# Altium footprint library TH_Connectors.PcbLib: 83 footprints (part 4 of 6)
Each footprint in its own frame and in the unit in brackets; x right, y up, seen from the top. Pads: shape width x height; smd on the part's side, far side on the other; paste and mask are expansions set on the pad; w line width, h text height; cw(c..) or ccw(c..) is an arc to the next point about the centre after c.
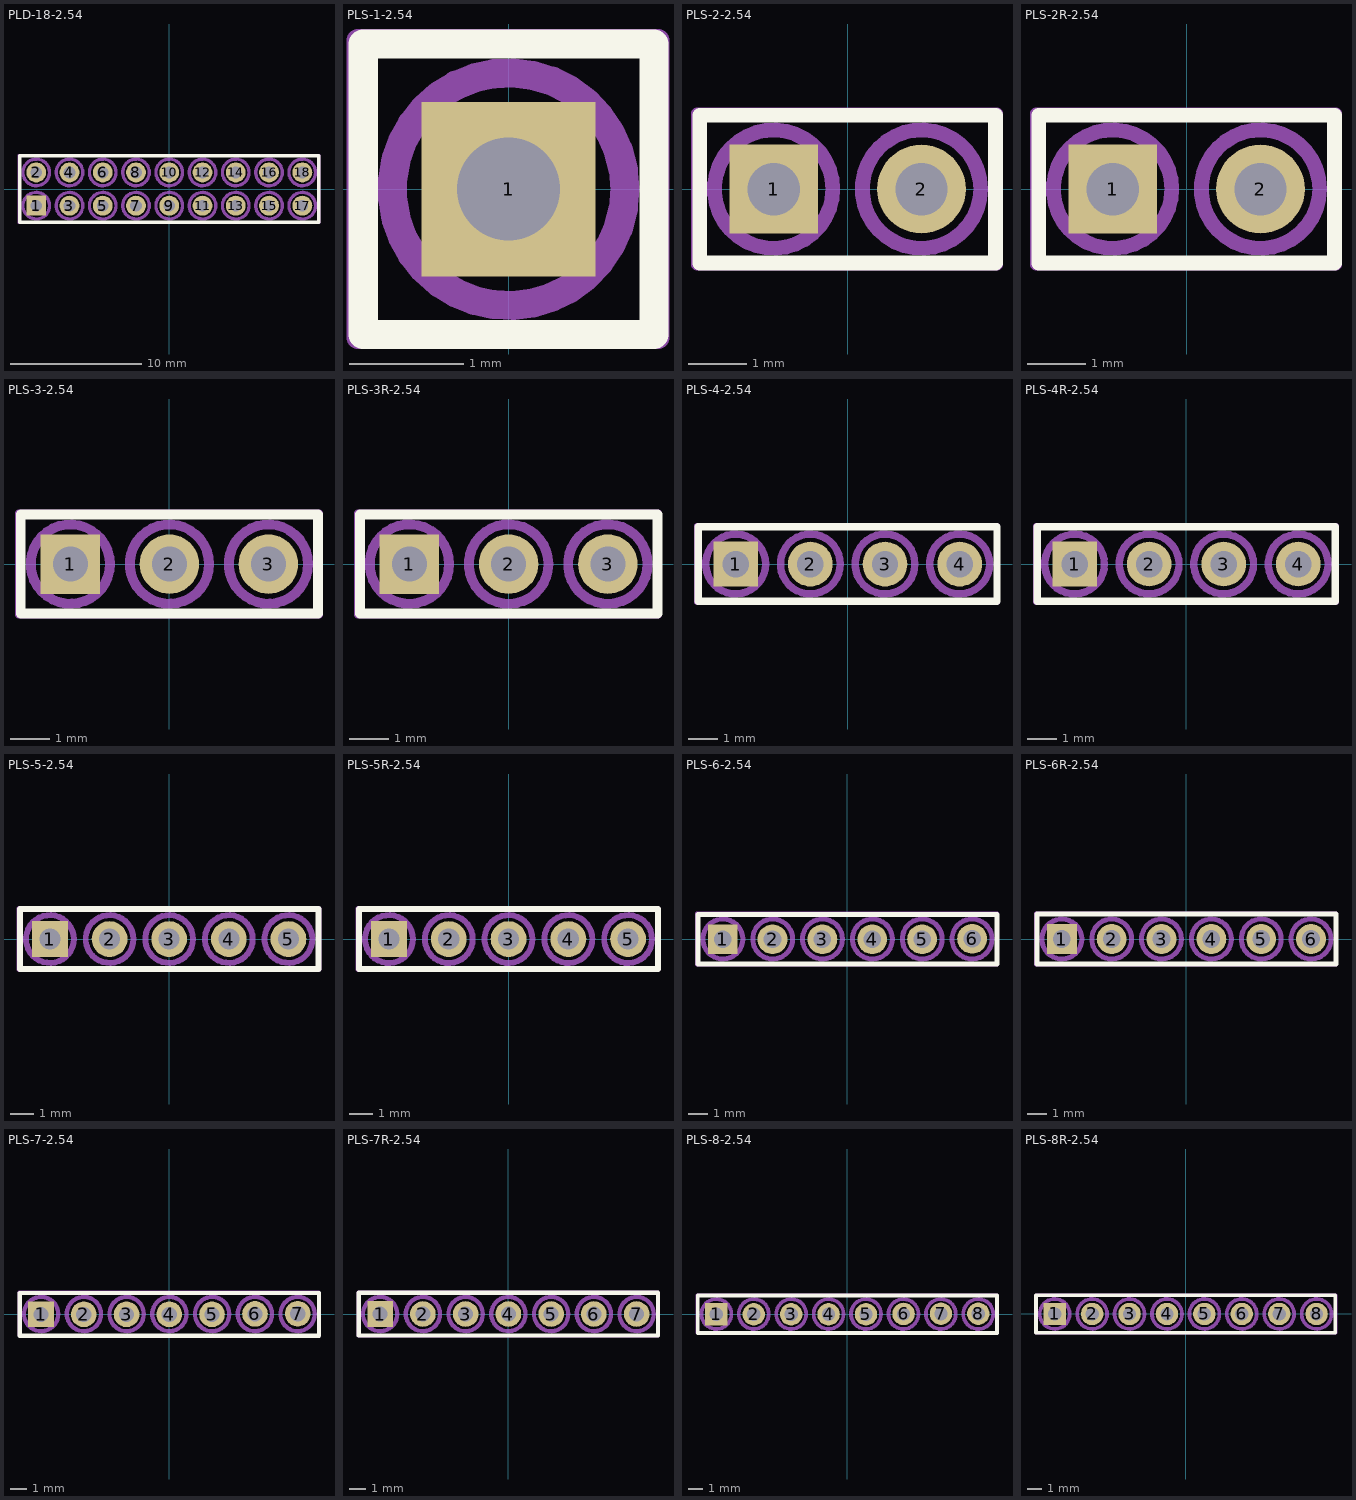
[diagram p3: the footprints below, top view; thin cyan lines are the x and y axes]

## PLD-18-2.54 [mil]
pads (18):
  rect 60x60 hole 35.43: 1(-400,-50)
  round 60 hole 35.43: 2(-400,50) 3(-300,-50) 4(-300,50) 5(-200,-50) 6(-200,50) 7(-100,-50) 8(-100,50) 9(0,-50) 10(0,50) 11(100,-50) 12(100,50) 13(200,-50) 14(200,50) 15(300,-50) 16(300,50) 17(400,-50) 18(400,50)
Top Overlay:
  lines w10: -450,-100 -450,100 450,100 450,-100 -450,-100
Top Assembly:
  lines w7.87: -451.81,-101.12 -451.81,101.31 450.28,101.31 450.28,-101.12 -451.81,-101.12
Bottom Assembly:
  circle w10: c400,-50 r40.05
  circle w10: c400,50 r40.05
  circle w10: c300,-50 r40.05
  circle w10: c300,50 r40.05
  circle w10: c200,-50 r40.05
  circle w10: c200,50 r40.05
  circle w10: c100,-50 r40.05
  circle w10: c100,50 r40.05
  circle w10: c0,-50 r40.05
  circle w10: c0,50 r40.05
  circle w10: c-100,-50 r40.05
  circle w10: c-100,50 r40.05
  circle w10: c-200,-50 r40.05
  circle w10: c-200,50 r40.05
  circle w10: c-300,-50 r40.05
  circle w10: c-300,50 r40.05
  circle w10: c-400,-50 r40.05
  circle w10: c-400,50 r40.05
3D body "PLS1.stp": height 336.22, standoff -118.11, extent 350,0 450,100
3D body "PLS1.stp": height 336.22, standoff -118.11, extent 350,-100 450,0
3D body "PLS1.stp": height 336.22, standoff -118.11, extent 250,0 350,100
3D body "PLS1.stp": height 336.22, standoff -118.11, extent 250,-100 350,0
3D body "PLS1.stp": height 336.22, standoff -118.11, extent 150,0 250,100
3D body "PLS1.stp": height 336.22, standoff -118.11, extent 150,-100 250,0
3D body "PLS1.stp": height 336.22, standoff -118.11, extent 50,0 150,100
3D body "PLS1.stp": height 336.22, standoff -118.11, extent 50,-100 150,0
3D body "PLS1.stp": height 336.22, standoff -118.11, extent -50,0 50,100
3D body "PLS1.stp": height 336.22, standoff -118.11, extent -50,-100 50,0
3D body "PLS1.stp": height 336.22, standoff -118.11, extent -150,0 -50,100
3D body "PLS1.stp": height 336.22, standoff -118.11, extent -150,-100 -50,0
3D body "PLS1.stp": height 336.22, standoff -118.11, extent -450,0 -350,100
3D body "PLS1.stp": height 336.22, standoff -118.11, extent -350,0 -250,100
3D body "PLS1.stp": height 336.22, standoff -118.11, extent -450,-100 -350,0
3D body "PLS1.stp": height 336.22, standoff -118.11, extent -350,-100 -250,0
3D body "PLS1.stp": height 336.22, standoff -118.11, extent -250,0 -150,100
3D body "PLS1.stp": height 336.22, standoff -118.11, extent -250,-100 -150,0

## PLS-1-2.54 [mil]
pads (1):
  rect 60x60 hole 35.43: 1(0,0)
Top Overlay:
  lines w10: -50,-50 -50,50 50,50 50,-50 -50,-50
Top Assembly:
  lines w7.87: -51.81,-51.12 -51.81,51.25 51.42,51.25 51.42,-51.12 -51.81,-51.12
Bottom Assembly:
  circle w10: c0,0 r40.05
3D body "PLS1.stp": height 336.22, standoff -118.11, extent -50,-50 50,50

## PLS-2-2.54 [mil]
pads (2):
  rect 60x60 hole 35.43: 1(-50,0)
  round 60 hole 35.43: 2(50,0)
Top Overlay:
  lines w10: -100,-50 100,-50 100,50 -100,50 -100,-50
Top Assembly:
  lines w7.87: -101.81,-51.12 101.08,-51.12 101.08,51.25 -101.81,51.25 -101.81,-51.12
Bottom Assembly:
  circle w10: c50,0 r40.05
  circle w10: c-50,0 r40.05
3D body "PLS1.stp": height 336.22, standoff -118.11, extent 0,-50 100,50
3D body "PLS1.stp": height 336.22, standoff -118.11, extent -100,-50 0,50

## PLS-2R-2.54 [mil]
pads (2):
  rect 60x60 hole 35.43: 1(-50,0)
  round 60 hole 35.43: 2(50,0)
Top Overlay:
  lines w10: -100,-50 -100,50 100,50 100,-50 -100,-50
Top Assembly:
  lines w7.87: -101.81,-51.12 101.08,-51.12 101.08,51.25 -101.81,51.25 -101.81,-51.12
Bottom Assembly:
  circle w10: c50,0 r40.05
  circle w10: c-50,0 r40.05
3D body "User Library-PLS-1R.STEP": height 229.57, standoff -103.11, extent -100,-50 0,289.37
3D body "User Library-PLS-1R.STEP": height 229.57, standoff -103.11, extent 0,-50 100,289.37

## PLS-3-2.54 [mil]
pads (3):
  rect 60x60 hole 35.43: 1(-100,0)
  round 60 hole 35.43: 2(0,0) 3(100,0)
Top Overlay:
  lines w10: -150,-50 150,-50 150,50 -150,50 -150,-50
Top Assembly:
  lines w7.87: -151.81,-51.12 -151.81,51.25 151.01,51.25 151.01,-51.12 -151.81,-51.12
Bottom Assembly:
  circle w10: c100,0 r40.05
  circle w10: c0,0 r40.05
  circle w10: c-100,0 r40.05
3D body "PLS1.stp": height 336.22, standoff -118.11, extent 50,-50 150,50
3D body "PLS1.stp": height 336.22, standoff -118.11, extent -50,-50 50,50
3D body "PLS1.stp": height 336.22, standoff -118.11, extent -150,-50 -50,50

## PLS-3R-2.54 [mil]
pads (3):
  rect 60x60 hole 35.43: 1(-100,0)
  round 60 hole 35.43: 2(0,0) 3(100,0)
Top Overlay:
  lines w10: -150,-50 -150,50 150,50 150,-50 -150,-50
Top Assembly:
  lines w7.87: -151.81,-51.12 150.57,-51.12 150.57,51.25 -151.81,51.25 -151.81,-51.12
Bottom Assembly:
  circle w10: c100,0 r40.05
  circle w10: c0,0 r40.05
  circle w10: c-100,0 r40.05
3D body "User Library-PLS-1R.STEP": height 229.57, standoff -103.11, extent -150,-50 -50,289.37
3D body "User Library-PLS-1R.STEP": height 229.57, standoff -103.11, extent -50,-50 50,289.37
3D body "User Library-PLS-1R.STEP": height 229.57, standoff -103.11, extent 50,-50 150,289.37

## PLS-4-2.54 [mil]
pads (4):
  rect 60x60 hole 35.43: 1(-150,0)
  round 60 hole 35.43: 2(-50,0) 3(50,0) 4(150,0)
Top Overlay:
  lines w10: -200,-50 200,-50 200,50 -200,50 -200,-50
Top Assembly:
  lines w7.87: -201.81,-51.12 -201.81,51.25 199.93,51.25 199.93,-51.12 -201.81,-51.12
Bottom Assembly:
  circle w10: c150,0 r40.05
  circle w10: c50,0 r40.05
  circle w10: c-50,0 r40.05
  circle w10: c-150,0 r40.05
3D body "PLS1.stp": height 336.22, standoff -118.11, extent 0,-50 100,50
3D body "PLS1.stp": height 336.22, standoff -118.11, extent -100,-50 0,50
3D body "PLS1.stp": height 336.22, standoff -118.11, extent -200,-50 -100,50
3D body "PLS1.stp": height 336.22, standoff -118.11, extent 100,-50 200,50

## PLS-4R-2.54 [mil]
pads (4):
  rect 60x60 hole 35.43: 1(-150,0)
  round 60 hole 35.43: 2(-50,0) 3(50,0) 4(150,0)
Top Overlay:
  lines w10: -200,-50 -200,50 200,50 200,-50 -200,-50
Top Assembly:
  lines w7.87: -201.81,-51.12 200.72,-51.12 200.72,51.25 -201.81,51.25 -201.81,-51.12
Bottom Assembly:
  circle w10: c150,0 r40.05
  circle w10: c50,0 r40.05
  circle w10: c-50,0 r40.05
  circle w10: c-150,0 r40.05
3D body "User Library-PLS-1R.STEP": height 229.57, standoff -103.11, extent -100,-50 0,289.37
3D body "User Library-PLS-1R.STEP": height 229.57, standoff -103.11, extent -200,-50 -100,289.37
3D body "User Library-PLS-1R.STEP": height 229.57, standoff -103.11, extent 100,-50 200,289.37
3D body "User Library-PLS-1R.STEP": height 229.57, standoff -103.11, extent 0,-50 100,289.37

## PLS-5-2.54 [mil]
pads (5):
  rect 60x60 hole 35.43: 1(-200,0)
  round 60 hole 35.43: 2(-100,0) 3(0,0) 4(100,0) 5(200,0)
Top Overlay:
  lines w10: -250,-50 250,-50 250,50 -250,50 -250,-50
Top Assembly:
  lines w7.87: -251.81,-51.12 251.2,-51.12 251.2,51.25 -251.81,51.25 -251.81,-51.12
Bottom Assembly:
  circle w10: c200,0 r40.05
  circle w10: c100,0 r40.05
  circle w10: c0,0 r40.05
  circle w10: c-100,0 r40.05
  circle w10: c-200,0 r40.05
3D body "PLS1.stp": height 336.22, standoff -118.11, extent 150,-50 250,50
3D body "PLS1.stp": height 336.22, standoff -118.11, extent -50,-50 50,50
3D body "PLS1.stp": height 336.22, standoff -118.11, extent -150,-50 -50,50
3D body "PLS1.stp": height 336.22, standoff -118.11, extent -250,-50 -150,50
3D body "PLS1.stp": height 336.22, standoff -118.11, extent 50,-50 150,50

## PLS-5R-2.54 [mil]
pads (5):
  rect 60x60 hole 35.43: 1(-200,0)
  round 60 hole 35.43: 2(-100,0) 3(0,0) 4(100,0) 5(200,0)
Top Overlay:
  lines w10: -150,50 250,50 ; 250,50 -250,50 -250,-50 250,-50 250,50
Top Assembly:
  lines w7.87: -251.81,-51.12 -251.81,51.25 250,51.25 250,-51.12 -251.81,-51.12
Bottom Assembly:
  circle w10: c-200,0 r40.05
  circle w10: c-100,0 r40.05
  circle w10: c0,0 r40.05
  circle w10: c100,0 r40.05
  circle w10: c200,0 r40.05
3D body "User Library-PLS-1R.STEP": height 229.57, standoff -103.11, extent -150,-50 -50,289.37
3D body "User Library-PLS-1R.STEP": height 229.57, standoff -103.11, extent -250,-50 -150,289.37
3D body "User Library-PLS-1R.STEP": height 229.57, standoff -103.11, extent 50,-50 150,289.37
3D body "User Library-PLS-1R.STEP": height 229.57, standoff -103.11, extent -50,-50 50,289.37
3D body "User Library-PLS-1R.STEP": height 229.57, standoff -103.11, extent 150,-50 250,289.37

## PLS-6-2.54 [mil]
pads (6):
  rect 60x60 hole 35.43: 1(-250.24,-0.52)
  round 60 hole 35.43: 2(-150.24,-0.52) 3(-50.24,-0.52) 4(49.76,-0.52) 5(149.76,-0.52) 6(250.24,0.52)
Top Overlay:
  lines w10: -300.24,-50.52 -300.24,49.48 299.76,49.48 299.76,-50.52 -300.24,-50.52
Top Assembly:
  lines w7.87: -301.81,-51.12 300,-51.12 300,51.25 -301.81,51.25 -301.81,-51.12
Bottom Assembly:
  circle w10: c250,0 r40.05
  circle w10: c150,0 r40.05
  circle w10: c50,0 r40.05
  circle w10: c-50,0 r40.05
  circle w10: c-150,0 r40.05
  circle w10: c-250,0 r40.05
3D body "PLS1.stp": height 336.22, standoff -118.11, extent -0.24,-50.52 99.76,49.48
3D body "PLS1.stp": height 336.22, standoff -118.11, extent -300.24,-50.52 -200.24,49.48
3D body "PLS1.stp": height 336.22, standoff -118.11, extent -200.24,-50.52 -100.24,49.48
3D body "PLS1.stp": height 336.22, standoff -118.11, extent -100.24,-50.52 -0.24,49.48
3D body "PLS1.stp": height 336.22, standoff -118.11, extent 99.76,-50.52 199.76,49.48
3D body "PLS1.stp": height 336.22, standoff -118.11, extent 200.24,-49.48 300.24,50.52

## PLS-6R-2.54 [mil]
pads (6):
  rect 60x60 hole 35.43: 1(-250,0)
  round 60 hole 35.43: 2(-150,0) 3(-50,0) 4(50,0) 5(150,0) 6(250,0)
Top Overlay:
  lines w10: -100,50 300,50 ; 200,50 -200,50 300,50 ; 300,50 -300,50 -300,-50 300,-50 300,50
Top Assembly:
  lines w7.87: -301.81,-51.12 300,-51.12 300,51.25 -301.81,51.25 -301.81,-51.12
Bottom Assembly:
  circle w10: c250,0 r40.05
  circle w10: c150,0 r40.05
  circle w10: c50,0 r40.05
  circle w10: c-50,0 r40.05
  circle w10: c-150,0 r40.05
  circle w10: c-250,0 r40.05
3D body "User Library-PLS-1R.STEP": height 229.57, standoff -103.11, extent -200,-50 -100,289.37
3D body "User Library-PLS-1R.STEP": height 229.57, standoff -103.11, extent -300,-50 -200,289.37
3D body "User Library-PLS-1R.STEP": height 229.57, standoff -103.11, extent 0,-50 100,289.37
3D body "User Library-PLS-1R.STEP": height 229.57, standoff -103.11, extent -100,-50 0,289.37
3D body "User Library-PLS-1R.STEP": height 229.57, standoff -103.11, extent 100,-50 200,289.37
3D body "User Library-PLS-1R.STEP": height 229.57, standoff -103.11, extent 200,-50 300,289.37

## PLS-7-2.54 [mil]
pads (7):
  rect 60x60 hole 35.43: 1(-300.24,-0.78)
  round 60 hole 35.43: 2(-200.24,-0.78) 3(-100.24,-0.78) 4(-0.24,-0.78) 5(99.76,-0.78) 6(200.24,0.26) 7(300.24,0.78)
Top Overlay:
  lines w10: -350.24,-50.78 350,-50.78 350,49.22 -350.24,49.22 -350.24,-50.78
Top Assembly:
  lines w7.87: -351.81,-51.12 350,-51.12 350,51.25 -351.81,51.25 -351.81,-51.12
Top Courtyard:
  lines w7.87: -351.81,-51.12 -351.81,51.25 350,51.25 350,-51.12 -351.81,-51.12
Bottom Courtyard (Mech16):
  circle w10: c-300,0 r40.05
  circle w10: c-200,0 r40.05
  circle w10: c-100,0 r40.05
  circle w10: c0,0 r40.05
  circle w10: c100,0 r40.05
  circle w10: c200,0 r40.05
  circle w10: c300,0 r40.05
3D body "PLS1.stp": height 336.22, standoff -118.11, extent 250.24,-49.23 350.24,50.77
3D body "PLS1.stp": height 336.22, standoff -118.11, extent 150.24,-49.74 250.24,50.26
3D body "PLS1.stp": height 336.22, standoff -118.11, extent 49.76,-50.77 149.76,49.23
3D body "PLS1.stp": height 336.22, standoff -118.11, extent -150.24,-50.77 -50.24,49.23
3D body "PLS1.stp": height 336.22, standoff -118.11, extent -250.24,-50.77 -150.24,49.23
3D body "PLS1.stp": height 336.22, standoff -118.11, extent -350.24,-50.77 -250.24,49.23
3D body "PLS1.stp": height 336.22, standoff -118.11, extent -50.24,-50.77 49.76,49.23

## PLS-7R-2.54 [mil]
pads (7):
  rect 60x60 hole 35.43: 1(-300,0)
  round 60 hole 35.43: 2(-200,0) 3(-100,0) 4(0,0) 5(100,0) 6(200,0) 7(300,0)
Top Overlay:
  lines w10: -150,50 250,50 -250,50 150,50 ; -350,-50 350,-50 350,50 -350,50 -350,-50
Top Assembly:
  lines w7.87: -351.81,-51.12 350,-51.12 350,51.25 -351.81,51.25 -351.81,-51.12
Top Courtyard:
  lines w7.87: -351.81,-51.12 350,-51.12 350,51.25 -351.81,51.25 -351.81,-51.12
Bottom Courtyard (Mech16):
  circle w10: c300,0 r40.05
  circle w10: c200,0 r40.05
  circle w10: c100,0 r40.05
  circle w10: c0,0 r40.05
  circle w10: c-100,0 r40.05
  circle w10: c-200,0 r40.05
  circle w10: c-300,0 r40.05
3D body "User Library-PLS-1R.STEP": height 229.57, standoff -103.11, extent 250,-50 350,289.37
3D body "User Library-PLS-1R.STEP": height 229.57, standoff -103.11, extent 150,-50 250,289.37
3D body "User Library-PLS-1R.STEP": height 229.57, standoff -103.11, extent 50,-50 150,289.37
3D body "User Library-PLS-1R.STEP": height 229.57, standoff -103.11, extent -150,-50 -50,289.37
3D body "User Library-PLS-1R.STEP": height 229.57, standoff -103.11, extent -50,-50 50,289.37
3D body "User Library-PLS-1R.STEP": height 229.57, standoff -103.11, extent -350,-50 -250,289.37
3D body "User Library-PLS-1R.STEP": height 229.57, standoff -103.11, extent -250,-50 -150,289.37

## PLS-8-2.54 [mil]
pads (8):
  rect 60x60 hole 35.43: 1(-350.12,-0.78)
  round 60 hole 35.43: 2(-250.12,-0.78) 3(-150.12,-0.78) 4(-50.12,-0.78) 5(49.88,-0.78) 6(150.36,0.26) 7(250.36,0.78) 8(350.12,0.78)
Top Overlay:
  lines w10: -400.12,-50.78 -400.12,49.22 400.12,49.22 400.12,-50.78 -400.12,-50.78
Top Assembly:
  lines w7.87: -401.81,-51.12 400,-51.12 400,51.25 -401.81,51.25 -401.81,-51.12
Top Courtyard:
  lines w7.87: -401.81,-51.12 400,-51.12 400,51.25 -401.81,51.25 -401.81,-51.12
Bottom Courtyard (Mech16):
  circle w10: c350,0 r40.05
  circle w10: c250,0 r40.05
  circle w10: c150,0 r40.05
  circle w10: c50,0 r40.05
  circle w10: c-50,0 r40.05
  circle w10: c-150,0 r40.05
  circle w10: c-250,0 r40.05
  circle w10: c-350,0 r40.05
3D body "PLS1.stp": height 336.22, standoff -118.11, extent -100.12,-50.77 -0.12,49.23
3D body "PLS1.stp": height 336.22, standoff -118.11, extent -400.12,-50.77 -300.12,49.23
3D body "PLS1.stp": height 336.22, standoff -118.11, extent -300.12,-50.77 -200.12,49.23
3D body "PLS1.stp": height 336.22, standoff -118.11, extent -200.12,-50.77 -100.12,49.23
3D body "PLS1.stp": height 336.22, standoff -118.11, extent -0.12,-50.77 99.88,49.23
3D body "PLS1.stp": height 336.22, standoff -118.11, extent 100.36,-49.74 200.36,50.26
3D body "PLS1.stp": height 336.22, standoff -118.11, extent 200.36,-49.23 300.36,50.77
3D body "PLS1.stp": height 336.22, standoff -118.11, extent 300.12,-49.23 400.12,50.77

## PLS-8R-2.54 [mil]
pads (8):
  rect 60x60 hole 35.43: 1(-350,0)
  round 60 hole 35.43: 2(-250,0) 3(-150,0) 4(-50,0) 5(50,0) 6(150,0) 7(250,0) 8(350,0)
Top Overlay:
  lines w10: -400,-50 -400,50 400,50 400,-50 -400,-50
Top Assembly:
  lines w7.87: -400,-51.25 -400,51.12 401.81,51.12 401.81,-51.25 -400,-51.25
Top Courtyard:
  lines w7.87: -400,-51.25 401.81,-51.25 401.81,51.12 -400,51.12 -400,-51.25
Bottom Courtyard (Mech16):
  circle w10: c-350,0 r40.05
  circle w10: c-250,0 r40.05
  circle w10: c-150,0 r40.05
  circle w10: c-50,0 r40.05
  circle w10: c50,0 r40.05
  circle w10: c150,0 r40.05
  circle w10: c250,0 r40.05
  circle w10: c350,0 r40.05
3D body "User Library-PLS-1R.STEP": height 229.57, standoff -103.11, extent -400,-50 -300,289.37
3D body "User Library-PLS-1R.STEP": height 229.57, standoff -103.11, extent -300,-50 -200,289.37
3D body "User Library-PLS-1R.STEP": height 229.57, standoff -103.11, extent -200,-50 -100,289.37
3D body "User Library-PLS-1R.STEP": height 229.57, standoff -103.11, extent -100,-50 0,289.37
3D body "User Library-PLS-1R.STEP": height 229.57, standoff -103.11, extent 0,-50 100,289.37
3D body "User Library-PLS-1R.STEP": height 229.57, standoff -103.11, extent 100,-50 200,289.37
3D body "User Library-PLS-1R.STEP": height 229.57, standoff -103.11, extent 200,-50 300,289.37
3D body "User Library-PLS-1R.STEP": height 229.57, standoff -103.11, extent 300,-50 400,289.37